# Altium footprint library 贴片电感.PcbLib: 92 footprints (part 1 of 6)
Each footprint in its own frame and in the unit in brackets; x right, y up, seen from the top. Pads: shape width x height; smd on the part's side, far side on the other; paste and mask are expansions set on the pad; w line width, h text height; cw(c..) or ccw(c..) is an arc to the next point about the centre after c.
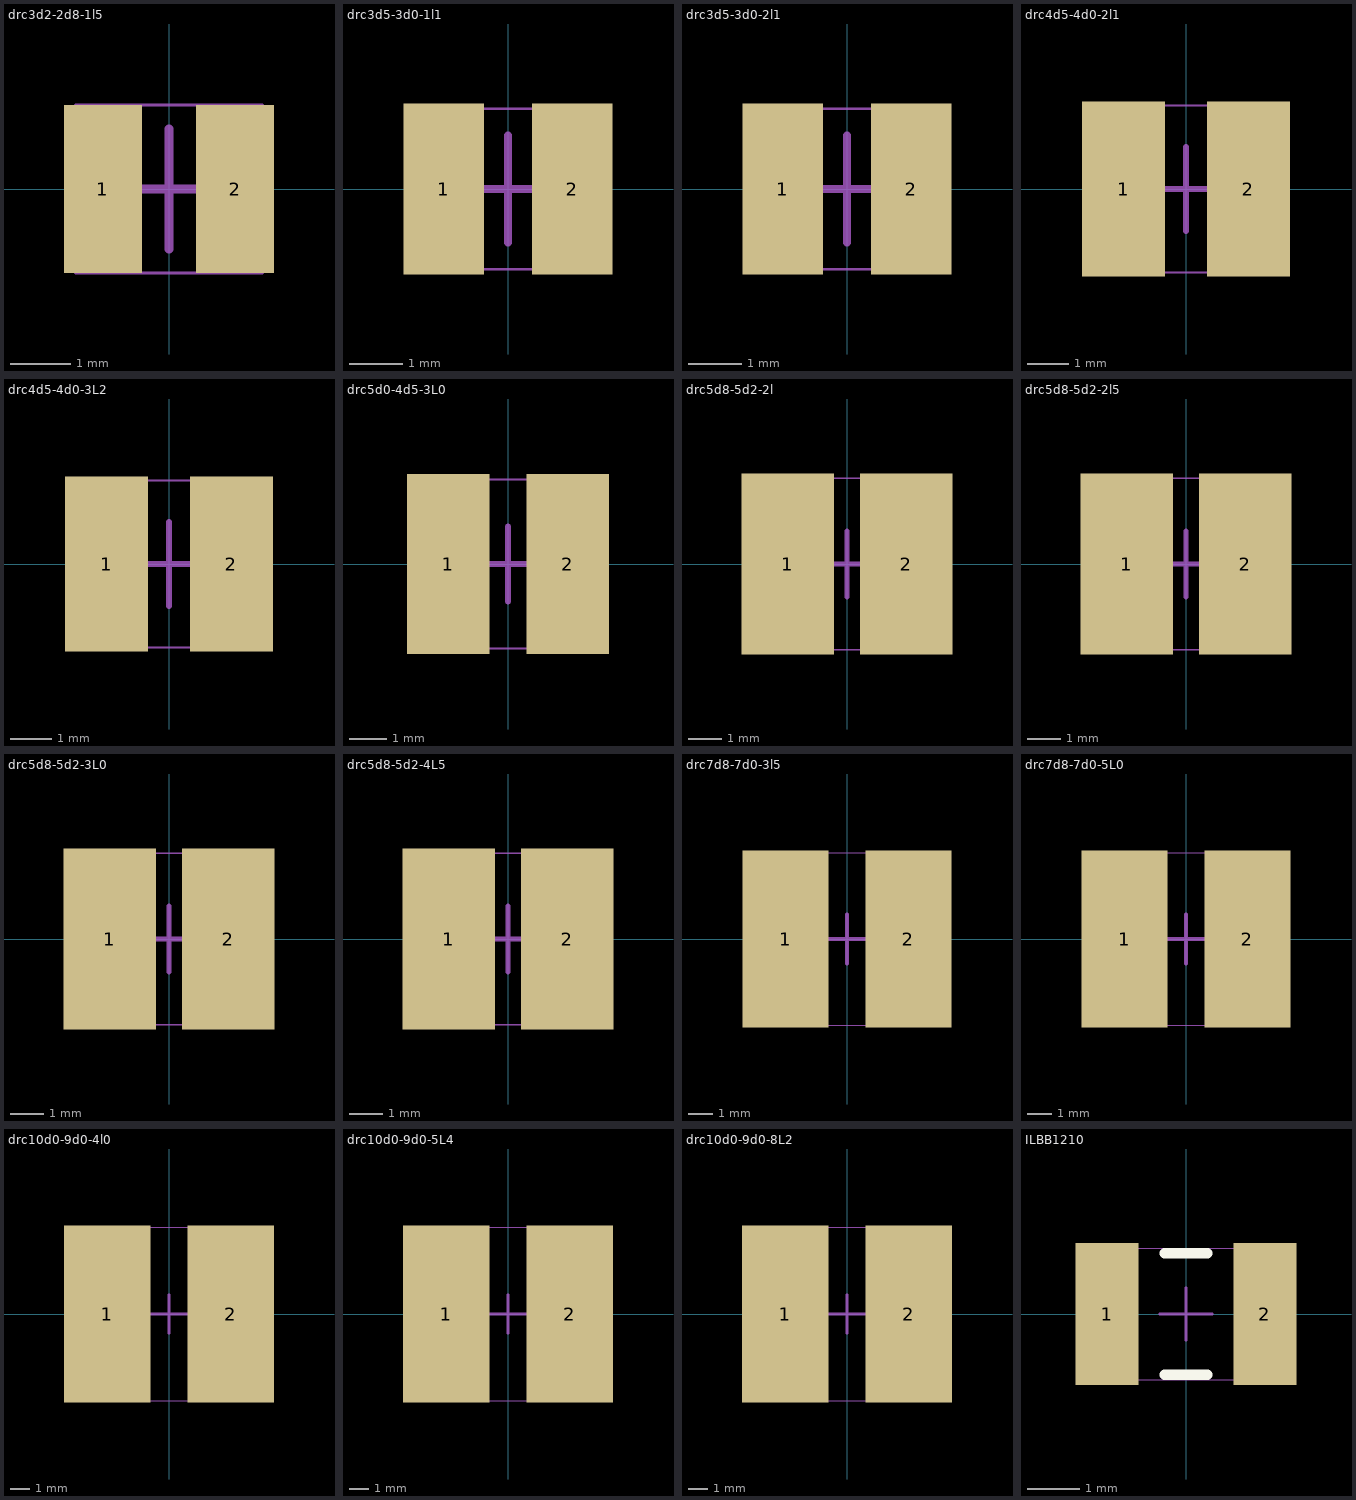
[diagram p0: the footprints below, top view; thin cyan lines are the x and y axes]

## drc3d2-2d8-1l5 [mm] "贴片工字电感"
height 1.5
pads (2):
  rect 1.3x2.8 smd: 1(-1.1,0) 2(1.1,0)
Mechanical 13:
  lines w0.05: -1.559,-1.4 1.559,-1.4 1.559,1.4 -1.559,1.4 -1.559,-1.4
Mechanical 15:
  lines w0.15: -1,0 1,0 ; 0,-1 0,1
3D body: height 1.5, standoff 0, extent -1.559,-1.4 1.559,1.4

## drc3d5-3d0-1l1 [mm] "贴片工字电感"
height 1.5
pads (2):
  rect 1.5x3.2 smd: 1(-1.2,0) 2(1.2,0)
Mechanical 13:
  lines w0.05: -1.712,-1.5 1.712,-1.5 1.712,1.5 -1.712,1.5 -1.712,-1.5
Mechanical 15:
  lines w0.15: -1,0 1,0 ; 0,-1 0,1
3D body: height 1.1, standoff 0, extent -1.712,-1.5 1.712,1.5

## drc3d5-3d0-2l1 [mm] "贴片工字电感"
height 2.1
pads (2):
  rect 1.5x3.2 smd: 1(-1.2,0) 2(1.2,0)
Mechanical 13:
  lines w0.05: -1.712,-1.5 -1.712,1.5 1.712,1.5 1.712,-1.5 -1.712,-1.5
Mechanical 15:
  lines w0.15: -1,0 1,0 ; 0,-1 0,1
3D body: height 2.15, standoff 0.05, extent -1.712,-1.5 1.713,1.5

## drc4d5-4d0-2l1 [mm] "贴片工字电感"
height 2.1
pads (2):
  rect 2x4.2 smd: 1(-1.5,0) 2(1.5,0)
Mechanical 13:
  lines w0.05: -2.221,-2 -2.221,2 2.221,2 2.221,-2 -2.221,-2
Mechanical 15:
  lines w0.15: -1,0 1,0 ; 0,-1 0,1
3D body: height 2.15, standoff 0.05, extent -2.221,-2 2.221,2

## drc4d5-4d0-3L2 [mm] "贴片工字电感"
height 3.2
pads (2):
  rect 2x4.2 smd: 1(-1.5,0) 2(1.5,0)
Mechanical 13:
  lines w0.05: -2.221,-2 2.221,-2 2.221,2 -2.221,2 -2.221,-2
Mechanical 15:
  lines w0.15: -1,0 1,0 ; 0,-1 0,1
3D body: height 3.3, standoff 0.1, extent -2.221,-2 2.222,2

## drc5d0-4d5-3L0 [mm] "贴片工字电感"
height 3
pads (2):
  rect 2.2x4.8 smd: 1(-1.6,0) 2(1.6,0)
Mechanical 13:
  lines w0.05: -2.474,-2.25 -2.474,2.25 2.474,2.25 2.474,-2.25 -2.474,-2.25
Mechanical 15:
  lines w0.15: -1,0 1,0 ; 0,-1 0,1
3D body: height 3.1, standoff 0.1, extent -2.474,-2.25 2.474,2.25

## drc5d8-5d2-2l [mm] "贴片工字电感"
height 2.1
pads (2):
  rect 2.8x5.5 smd: 1(-1.8,0) 2(1.8,0)
Mechanical 13:
  lines w0.05: -2.849,-2.6 -2.849,2.6 2.849,2.6 2.849,-2.6 -2.849,-2.6
Mechanical 15:
  lines w0.15: -1,0 1,0 ; 0,-1 0,1
3D body: height 2.03, standoff 0.03, extent -2.849,-2.6 2.849,2.6

## drc5d8-5d2-2l5 [mm] "贴片工字电感"
height 2.5
pads (2):
  rect 2.8x5.5 smd: 1(-1.8,0) 2(1.8,0)
Mechanical 13:
  lines w0.05: -2.849,-2.6 -2.849,2.6 2.849,2.6 2.849,-2.6 -2.849,-2.6
Mechanical 15:
  lines w0.15: -1,0 1,0 ; 0,-1 0,1
3D body: height 2.55, standoff 0.05, extent -2.849,-2.6 2.849,2.6

## drc5d8-5d2-3L0 [mm] "贴片工字电感"
height 3
pads (2):
  rect 2.8x5.5 smd: 1(-1.8,0) 2(1.8,0)
Mechanical 13:
  lines w0.05: -2.849,-2.6 -2.849,2.6 2.849,2.6 2.849,-2.6 -2.849,-2.6
Mechanical 15:
  lines w0.15: -1,0 1,0 ; 0,-1 0,1
3D body: height 3.1, standoff 0.1, extent -2.849,-2.6 2.849,2.6

## drc5d8-5d2-4L5 [mm] "贴片工字电感"
height 4.5
pads (2):
  rect 2.8x5.5 smd: 1(-1.8,0) 2(1.8,0)
Mechanical 13:
  lines w0.05: -2.849,-2.6 2.849,-2.6 2.849,2.6 -2.849,2.6 -2.849,-2.6
Mechanical 15:
  lines w0.15: -1,0 1,0 ; 0,-1 0,1
3D body: height 4.5, standoff 0, extent -2.849,-2.6 2.849,2.6

## drc7d8-7d0-3l5 [mm] "贴片工字电感"
height 3.5
pads (2):
  rect 3.5x7.2 smd: 1(-2.5,0) 2(2.5,0)
Mechanical 13:
  lines w0.05: -3.863,-3.5 3.863,-3.5 3.863,3.5 -3.863,3.5 -3.863,-3.5
Mechanical 15:
  lines w0.15: -1,0 1,0 ; 0,-1 0,1
3D body: height 3.55, standoff 0.05, extent -3.863,-3.5 3.863,3.5

## drc7d8-7d0-5L0 [mm] "贴片工字电感"
height 5
pads (2):
  rect 3.5x7.2 smd: 1(-2.5,0) 2(2.5,0)
Mechanical 13:
  lines w0.05: -3.863,-3.5 -3.863,3.5 3.863,3.5 3.863,-3.5 -3.863,-3.5
Mechanical 15:
  lines w0.15: -1,0 1,0 ; 0,-1 0,1
3D body: height 5, standoff 0, extent -3.863,-3.5 3.863,3.5

## drc10d0-9d0-4l0 [mm] "贴片工字电感"
height 4
pads (2):
  rect 4.5x9.2 smd: 1(-3.2,0) 2(3.2,0)
Mechanical 13:
  lines w0.05: -4.959,-4.5 -4.959,4.5 4.959,4.5 4.959,-4.5 -4.959,-4.5
Mechanical 15:
  lines w0.15: -1,0 1,0 ; 0,-1 0,1
3D body: height 4.15, standoff 0.15, extent -4.959,-4.5 4.959,4.5

## drc10d0-9d0-5L4 [mm] "贴片工字电感"
height 5.4
pads (2):
  rect 4.5x9.2 smd: 1(-3.2,0) 2(3.2,0)
Mechanical 13:
  lines w0.05: -4.959,-4.5 -4.959,4.5 4.959,4.5 4.959,-4.5 -4.959,-4.5
Mechanical 15:
  lines w0.15: -1,0 1,0 ; 0,-1 0,1
3D body: height 5.5, standoff 0.1, extent -4.959,-4.5 4.959,4.5

## drc10d0-9d0-8L2 [mm] "贴片工字电感"
height 8.2
pads (2):
  rect 4.5x9.2 smd: 1(-3.2,0) 2(3.2,0)
Mechanical 13:
  lines w0.05: -4.959,-4.5 -4.959,4.5 4.959,4.5 4.959,-4.5 -4.959,-4.5
Mechanical 15:
  lines w0.15: -1,0 1,0 ; 0,-1 0,1
3D body: height 7.1, standoff -1.1, extent -4.959,-4.5 4.959,4.5

## ILBB1210 [mm] "贴片磁珠"
height 1.3
pads (2):
  rect 1.2x2.7 smd: 1(-1.5,0) 2(1.5,0)
Top Overlay:
  lines w0.2: -0.4,-1.15 0.4,-1.15 ; -0.4,1.15 0.4,1.15
Mechanical 13:
  lines w0.01: -1.6,-1.25 -1.6,1.25 1.6,1.25 1.6,-1.25 -1.6,-1.25
Mechanical 15:
  lines w0.05: -0.5,0 0.5,0 ; 0,-0.5 0,0.5
3D body: height 1.35, standoff 0.05, extent -1.6,-1.25 1.6,1.25